# Altium footprint library Cty1.PcbLib: 869 footprints (part 55 of 55)
Each footprint in its own frame and in the unit in brackets; x right, y up, seen from the top. Pads: shape width x height; smd on the part's side, far side on the other; paste and mask are expansions set on the pad; w line width, h text height; cw(c..) or ccw(c..) is an arc to the next point about the centre after c.
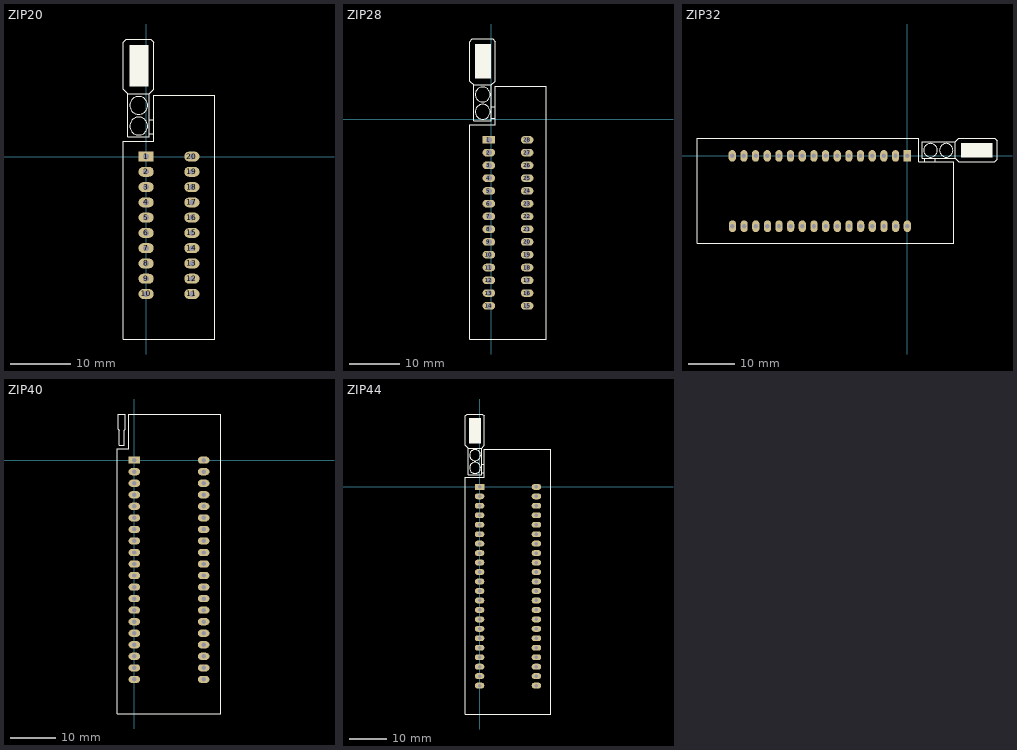
[diagram p54: the footprints below, top view; thin cyan lines are the x and y axes]

## ZIP20 [mil] "DIP 20, W 600mil/ L 1600mil"
height 300
pads (20):
  rect 100x65 hole 38: 1(0,0)
  oval 100x65 hole 38: 2(0,-100) 3(0,-200) 4(0,-300) 5(0,-400) 6(0,-500) 7(0,-600) 8(0,-700) 9(0,-800) 10(0,-900) 11(300,-900) 12(300,-800) 13(300,-700) 14(300,-600) 15(300,-500) 16(300,-400) 17(300,-300) 18(300,-200) 19(300,-100) 20(300,0)
Top Overlay:
  circle w7: c-48.31,335 r58.31
  circle w7: c-48.31,200 r58.31
  rectangle: -110,460 15,730
  lines w7: 20,150 50,150 ; 20,240 50,240 ; -120,410 -120,130 -110,130 20,130 20,410 ; -120,410 -150,440 -150,750 -130,770 30,770 50,750 50,440 20,410 ; -120,410 20,410 ; -150,-1195 -150,100 50,100 50,400 450,400 450,-1195 -150,-1195

## ZIP28 [mm]
height 0.305
pads (28):
  rect 2.5x1.5 hole 1.2: 1(-0.508,-4.064)
  oval 2.5x1.5 hole 1.2: 2(-0.508,-6.604) 3(-0.508,-9.144) 4(-0.508,-11.684) 5(-0.508,-14.224) 6(-0.508,-16.764) 7(-0.508,-19.304) 8(-0.508,-21.844) 9(-0.508,-24.384) 10(-0.508,-26.924) 11(-0.508,-29.464) 12(-0.508,-32.004) 13(-0.508,-34.544) 14(-0.508,-37.084) 15(7.112,-37.084) 16(7.112,-34.544) 17(7.112,-32.004) 18(7.112,-29.464) 19(7.112,-26.924) 20(7.112,-24.384) 21(7.112,-21.844) 22(7.112,-19.304) 23(7.112,-16.764) 24(7.112,-14.224) 25(7.112,-11.684) 26(7.112,-9.144) 27(7.112,-6.604) 28(7.112,-4.064)
Top Overlay:
  circle w0.178: c-1.735,4.953 r1.481
  circle w0.178: c-1.735,1.524 r1.481
  rectangle: -3.302,8.128 -0.127,14.986
  lines w0.178: 0,0.254 0.762,0.254 ; 0,2.54 0.762,2.54 ; -3.556,6.858 -3.556,-0.254 -3.302,-0.254 0,-0.254 0,6.858 ; -3.556,6.858 -4.318,7.62 -4.318,15.494 -3.81,16.002 0.254,16.002 0.762,15.494 0.762,7.62 0,6.858 ; -3.556,6.858 0,6.858 ; -4.318,-43.688 -4.318,-1.016 0.762,-1.016 0.762,6.604 10.922,6.604 10.922,-43.688 -4.318,-43.688

## ZIP32 [mil] "32 PIN, W 900 mil , L 2200 mil , Push Pro FOR Chip"
height 300
pads (32):
  rect 62x100 hole 38: 1(0,0)
  oval 62x100 hole 38: 2(-100,0) 3(-200,0) 4(-300,0) 5(-400,0) 6(-500,0) 7(-600,0) 8(-700,0) 9(-800,0) 10(-900,0) 11(-1000,0) 12(-1100,0) 13(-1200,0) 14(-1300,0) 15(-1400,0) 16(-1500,0) 17(-1498,-603) 18(-1398,-603) 19(-1298,-603) 20(-1198,-603) 21(-1099,-603) 22(-999,-603) 23(-899,-603) 24(-799,-603) 25(-699,-603) 26(-599,-603) 27(-499,-603) 28(-399,-603) 29(-299,-603) 30(-199,-603) 31(-99,-603) 32(1,-603)
Top Overlay:
  circle w7: c335,48.31 r58.31
  circle w7: c200,48.31 r58.31
  region: 460,110 460,-15 730,-15 730,110
  lines w7: 150,-50 150,-20 ; 240,-50 240,-20 ; 410,-20 440,-50 750,-50 770,-30 770,130 750,150 440,150 410,120 ; 410,-20 130,-20 130,110 130,120 410,120 ; 410,-20 410,120 ; -1802,-750 -1802,150 100,150 100,-50 400,-50 400,-600 400,-750 -1802,-750

## ZIP40 [mil] "40 PIN, W 900 mil , L 2600 mil , Push Pro FOR Chip"
height 300
pads (40):
  rect 100x62 hole 38: 1(0,0)
  oval 100x62 hole 38: 2(0,-100) 3(0,-200) 4(0,-300) 5(0,-400) 6(0,-500) 7(0,-600) 8(0,-700) 9(0,-800) 10(0,-900) 11(0,-1000) 12(0,-1100) 13(0,-1200) 14(0,-1300) 15(0,-1400) 16(0,-1500) 17(0,-1600) 18(0,-1700) 19(0,-1800) 20(0,-1900) 21(600,-1900) 22(600,-1800) 23(600,-1700) 24(600,-1600) 25(600,-1500) 26(600,-1400) 27(600,-1300) 28(600,-1200) 29(600,-1100) 30(600,-1000) 31(600,-900) 32(600,-800) 33(600,-700) 34(600,-600) 35(600,-500) 36(600,-400) 37(600,-300) 38(600,-200) 39(600,-100) 40(600,0)
Top Overlay:
  lines w7: -150,100 -150,-2200 750,-2200 750,400 600,400 50,400
  lines w7.01: -150,100 -50,100 -50,400 50,400 ; -140,270 -140,400 -80,400 -80,270 -90,260 -90,130 -110,130 -130,130 -130,260 -140,270
3D body: height 443.07, standoff -186.85, extent -189.6,-2144.51 750,894.51

## ZIP44 [mil] "40 PIN, W 900 mil , L 2600 mil , Push Pro FOR Chip"
height 300
pads (44):
  rect 100x62 hole 38: 1(0,0)
  oval 100x62 hole 38: 2(0,-100) 3(0,-200) 4(0,-300) 5(0,-400) 6(0,-500) 7(0,-600) 8(0,-700) 9(0,-800) 10(0,-900) 11(0,-1000) 12(0,-1100) 13(0,-1200) 14(0,-1300) 15(0,-1400) 16(0,-1500) 17(0,-1600) 18(0,-1700) 19(0,-1800) 20(0,-1900) 21(0,-2000) 22(0,-2100) 23(600,-2100) 24(600,-2000) 25(600,-1900) 26(600,-1800) 27(600,-1700) 28(600,-1600) 29(600,-1500) 30(600,-1400) 31(600,-1300) 32(600,-1200) 33(600,-1100) 34(600,-1000) 35(600,-900) 36(600,-800) 37(600,-700) 38(600,-600) 39(600,-500) 40(600,-400) 41(600,-300) 42(600,-200) 43(600,-100) 44(600,0)
Top Overlay:
  circle w7: c-48.31,335 r58.31
  circle w7: c-48.31,200 r58.31
  rectangle: -110,460 15,730
  lines w7: 20,150 50,150 ; 20,240 50,240 ; -120,410 -120,130 -110,130 20,130 20,410 ; -120,410 -150,440 -150,750 -130,770 30,770 50,750 50,440 20,410 ; -120,410 20,410 ; -150,-2400 -150,100 50,100 50,400 600,400 750,400 750,-2400 -150,-2400